# Altium schematic symbol library jlcpcb_2025_04_capacitors_extended_1206.schlib: 2503 symbols (part 6 of 14)
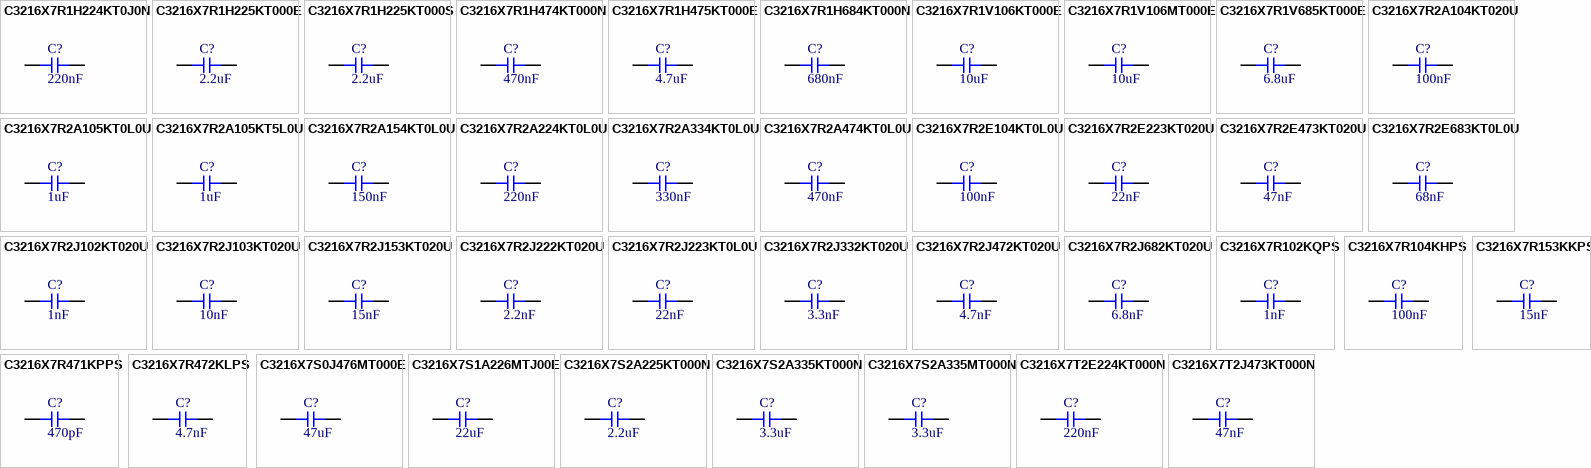
[diagram p67: symbols C3216X7R1H224KT0J0N to C3216X7T2J473KT000N]

## C3216X7R2J153KT020U
designator C?  Capacitance: 15nF  (hidden comment: *)
Capacitor, Ceramic (MLCC), 15nF, ±10%, 630V, X7R, ±10%, SMD 1206; Manufacturer: TDK; Manufacturer Part Number: C3216X7R2J153KT020U; Package Size: 1206; JLCPCB Basic Part: No; JLCPCB Part Number: C76675; Supplier 1: LCSC; Category: Capacitors - MLCC; Supplier Part Number 1: C76675; Tolerance: ±10%; Voltage Rating: 630V; Temperature Coefficient: X7R; RoHS: Yes; ComponentLink1Description: Datasheet; ComponentLink1URL: https://wmsc.lcsc.com/wmsc/upload/file/pdf/v2/lcsc/2304140030_TDK-C3216X7R2J153KT020U_C76675.pdf; ComponentLink2Description: JLCPCB Part URL; ComponentLink2URL: https://jlcpcb.com/partdetail/C76675; ComponentLink3Description: LCSC Part URL; ComponentLink3URL: https://lcsc.com/product-detail/Multilayer-Ceramic-Capacitors-MLCC---SMD-SMT_TDK-TDK-C3216X7R2J153KT020U_C76675.html
footprint CAP-1206 (1206 (3216M) Capacitor)
pins: 1, 2

## C3216X7R2J222KT020U
designator C?  Capacitance: 2.2nF  (hidden comment: *)
Capacitor, Ceramic (MLCC), 2.2nF, ±10%, 630V, X7R, ±10%, SMD 1206; Manufacturer: TDK; Manufacturer Part Number: C3216X7R2J222KT020U; Package Size: 1206; JLCPCB Basic Part: No; JLCPCB Part Number: C342855; Supplier 1: LCSC; Category: Capacitors - MLCC; Supplier Part Number 1: C342855; Tolerance: ±10%; Voltage Rating: 630V; Temperature Coefficient: X7R; RoHS: Yes; ComponentLink1Description: Datasheet; ComponentLink1URL: https://wmsc.lcsc.com/wmsc/upload/file/pdf/v2/lcsc/2304140030_TDK-C3216X7R2J222KT020U_C342855.pdf; ComponentLink2Description: JLCPCB Part URL; ComponentLink2URL: https://jlcpcb.com/partdetail/C342855; ComponentLink3Description: LCSC Part URL; ComponentLink3URL: https://lcsc.com/product-detail/Multilayer-Ceramic-Capacitors-MLCC---SMD-SMT_TDK-TDK-C3216X7R2J222KT020U_C342855.html
footprint CAP-1206 (1206 (3216M) Capacitor)
pins: 1, 2

## C3216X7R2J223KT0L0U
designator C?  Capacitance: 22nF  (hidden comment: *)
Capacitor, Ceramic (MLCC), 22nF, ±10%, 630V, X7R, ±10%, SMD 1206; Manufacturer: TDK; Manufacturer Part Number: C3216X7R2J223KT0L0U; Package Size: 1206; JLCPCB Basic Part: No; JLCPCB Part Number: C342858; Supplier 1: LCSC; Category: Capacitors - MLCC; Supplier Part Number 1: C342858; Tolerance: ±10%; Voltage Rating: 630V; Temperature Coefficient: X7R; RoHS: Yes; ComponentLink1Description: Datasheet; ComponentLink1URL: https://wmsc.lcsc.com/wmsc/upload/file/pdf/v2/lcsc/2304140030_TDK-C3216X7R2J223KT0L0U_C342858.pdf; ComponentLink2Description: JLCPCB Part URL; ComponentLink2URL: https://jlcpcb.com/partdetail/C342858; ComponentLink3Description: LCSC Part URL; ComponentLink3URL: https://lcsc.com/product-detail/Multilayer-Ceramic-Capacitors-MLCC---SMD-SMT_TDK-TDK-C3216X7R2J223KT0L0U_C342858.html
footprint CAP-1206 (1206 (3216M) Capacitor)
pins: 1, 2

## C3216X7R2J332KT020U
designator C?  Capacitance: 3.3nF  (hidden comment: *)
Capacitor, Ceramic (MLCC), 3.3nF, ±10%, 630V, X7R, ±10%, SMD 1206; Manufacturer: TDK; Manufacturer Part Number: C3216X7R2J332KT020U; Package Size: 1206; JLCPCB Basic Part: No; JLCPCB Part Number: C76677; Supplier 1: LCSC; Category: Capacitors - MLCC; Supplier Part Number 1: C76677; Tolerance: ±10%; Voltage Rating: 630V; Temperature Coefficient: X7R; RoHS: Yes; ComponentLink1Description: Datasheet; ComponentLink1URL: https://wmsc.lcsc.com/wmsc/upload/file/pdf/v2/lcsc/2304140030_TDK-C3216X7R2J332KT020U_C76677.pdf; ComponentLink2Description: JLCPCB Part URL; ComponentLink2URL: https://jlcpcb.com/partdetail/C76677; ComponentLink3Description: LCSC Part URL; ComponentLink3URL: https://lcsc.com/product-detail/Multilayer-Ceramic-Capacitors-MLCC---SMD-SMT_TDK-TDK-C3216X7R2J332KT020U_C76677.html
footprint CAP-1206 (1206 (3216M) Capacitor)
pins: 1, 2

## C3216X7R2J472KT020U
designator C?  Capacitance: 4.7nF  (hidden comment: *)
Capacitor, Ceramic (MLCC), 4.7nF, ±10%, 630V, X7R, ±10%, SMD 1206; Manufacturer: TDK; Manufacturer Part Number: C3216X7R2J472KT020U; Package Size: 1206; JLCPCB Basic Part: No; JLCPCB Part Number: C342859; Supplier 1: LCSC; Category: Capacitors - MLCC; Supplier Part Number 1: C342859; Tolerance: ±10%; Voltage Rating: 630V; Temperature Coefficient: X7R; RoHS: Yes; ComponentLink1Description: Datasheet; ComponentLink1URL: https://wmsc.lcsc.com/wmsc/upload/file/pdf/v2/lcsc/2304140030_TDK-C3216X7R2J472KT020U_C342859.pdf; ComponentLink2Description: JLCPCB Part URL; ComponentLink2URL: https://jlcpcb.com/partdetail/C342859; ComponentLink3Description: LCSC Part URL; ComponentLink3URL: https://lcsc.com/product-detail/Multilayer-Ceramic-Capacitors-MLCC---SMD-SMT_TDK-TDK-C3216X7R2J472KT020U_C342859.html
footprint CAP-1206 (1206 (3216M) Capacitor)
pins: 1, 2

## C3216X7R2J682KT020U
designator C?  Capacitance: 6.8nF  (hidden comment: *)
Capacitor, Ceramic (MLCC), 6.8nF, ±10%, 630V, X7R, ±10%, SMD 1206; Manufacturer: TDK; Manufacturer Part Number: C3216X7R2J682KT020U; Package Size: 1206; JLCPCB Basic Part: No; JLCPCB Part Number: C694467; Supplier 1: LCSC; Category: Capacitors - MLCC; Supplier Part Number 1: C694467; Tolerance: ±10%; Voltage Rating: 630V; Temperature Coefficient: X7R; RoHS: Yes; ComponentLink1Description: Datasheet; ComponentLink1URL: https://wmsc.lcsc.com/wmsc/upload/file/pdf/v2/lcsc/2304140030_TDK-C3216X7R2J682KT020U_C694467.pdf; ComponentLink2Description: JLCPCB Part URL; ComponentLink2URL: https://jlcpcb.com/partdetail/C694467; ComponentLink3Description: LCSC Part URL; ComponentLink3URL: https://lcsc.com/product-detail/Multilayer-Ceramic-Capacitors-MLCC---SMD-SMT_TDK-TDK-C3216X7R2J682KT020U_C694467.html
footprint CAP-1206 (1206 (3216M) Capacitor)
pins: 1, 2

## C3216X7R102KQPS
designator C?  Capacitance: 1nF  (hidden comment: *)
Capacitor, Ceramic (MLCC), 1nF, ±10%, 2kV, X7R, ±10%, SMD 1206; Manufacturer: Darfon Elec; Manufacturer Part Number: C3216X7R102KQPS; Package Size: 1206; JLCPCB Basic Part: No; JLCPCB Part Number: C725573; Supplier 1: LCSC; Category: Capacitors - MLCC; Supplier Part Number 1: C725573; Tolerance: ±10%; Voltage Rating: 2kV; Temperature Coefficient: X7R; RoHS: Yes; ComponentLink1Description: Datasheet; ComponentLink1URL: https://wmsc.lcsc.com/wmsc/upload/file/pdf/v2/lcsc/2304140030_Darfon-Elec-C3216X7R102KQPS_C725573.pdf; ComponentLink2Description: JLCPCB Part URL; ComponentLink2URL: https://jlcpcb.com/partdetail/C725573; ComponentLink3Description: LCSC Part URL; ComponentLink3URL: https://lcsc.com/product-detail/Multilayer-Ceramic-Capacitors-MLCC---SMD-SMT_Darfon-Elec-Darfon-Elec-C3216X7R102KQPS_C725573.html
footprint CAP-1206 (1206 (3216M) Capacitor)
pins: 1, 2

## C3216X7R104KHPS
designator C?  Capacitance: 100nF  (hidden comment: *)
Capacitor, Ceramic (MLCC), 100nF, ±10%, 100V, X7R, ±10%, SMD 1206; Manufacturer: Darfon Elec; Manufacturer Part Number: C3216X7R104KHPS; Package Size: 1206; JLCPCB Basic Part: No; JLCPCB Part Number: C725584; Supplier 1: LCSC; Category: Capacitors - MLCC; Supplier Part Number 1: C725584; Tolerance: ±10%; Voltage Rating: 100V; Temperature Coefficient: X7R; RoHS: Yes; ComponentLink1Description: Datasheet; ComponentLink1URL: https://wmsc.lcsc.com/wmsc/upload/file/pdf/v2/lcsc/2304140030_Darfon-Elec-C3216X7R104KHPS_C725584.pdf; ComponentLink2Description: JLCPCB Part URL; ComponentLink2URL: https://jlcpcb.com/partdetail/C725584; ComponentLink3Description: LCSC Part URL; ComponentLink3URL: https://lcsc.com/product-detail/Multilayer-Ceramic-Capacitors-MLCC---SMD-SMT_Darfon-Elec-Darfon-Elec-C3216X7R104KHPS_C725584.html
footprint CAP-1206 (1206 (3216M) Capacitor)
pins: 1, 2

## C3216X7R153KKPS
designator C?  Capacitance: 15nF  (hidden comment: *)
Capacitor, Ceramic (MLCC), 15nF, ±10%, 250V, X7R, ±10%, SMD 1206; Manufacturer: Darfon Elec; Manufacturer Part Number: C3216X7R153KKPS; Package Size: 1206; JLCPCB Basic Part: No; JLCPCB Part Number: C725583; Supplier 1: LCSC; Category: Capacitors - MLCC; Supplier Part Number 1: C725583; Tolerance: ±10%; Voltage Rating: 250V; Temperature Coefficient: X7R; RoHS: Yes; ComponentLink1Description: Datasheet; ComponentLink1URL: https://wmsc.lcsc.com/wmsc/upload/file/pdf/v2/lcsc/2304140030_Darfon-Elec-C3216X7R153KKPS_C725583.pdf; ComponentLink2Description: JLCPCB Part URL; ComponentLink2URL: https://jlcpcb.com/partdetail/C725583; ComponentLink3Description: LCSC Part URL; ComponentLink3URL: https://lcsc.com/product-detail/Multilayer-Ceramic-Capacitors-MLCC---SMD-SMT_Darfon-Elec-Darfon-Elec-C3216X7R153KKPS_C725583.html
footprint CAP-1206 (1206 (3216M) Capacitor)
pins: 1, 2

## C3216X7R471KPPS
designator C?  Capacitance: 470pF  (hidden comment: *)
Capacitor, Ceramic (MLCC), 470pF, ±10%, 1kV, X7R, ±10%, SMD 1206; Manufacturer: Darfon Elec; Manufacturer Part Number: C3216X7R471KPPS; Package Size: 1206; JLCPCB Basic Part: No; JLCPCB Part Number: C725581; Supplier 1: LCSC; Category: Capacitors - MLCC; Supplier Part Number 1: C725581; Tolerance: ±10%; Voltage Rating: 1kV; Temperature Coefficient: X7R; RoHS: Yes; ComponentLink1Description: Datasheet; ComponentLink1URL: https://wmsc.lcsc.com/wmsc/upload/file/pdf/v2/lcsc/2304140030_Darfon-Elec-C3216X7R471KPPS_C725581.pdf; ComponentLink2Description: JLCPCB Part URL; ComponentLink2URL: https://jlcpcb.com/partdetail/C725581; ComponentLink3Description: LCSC Part URL; ComponentLink3URL: https://lcsc.com/product-detail/Multilayer-Ceramic-Capacitors-MLCC---SMD-SMT_Darfon-Elec-Darfon-Elec-C3216X7R471KPPS_C725581.html
footprint CAP-1206 (1206 (3216M) Capacitor)
pins: 1, 2

## C3216X7R472KLPS
designator C?  Capacitance: 4.7nF  (hidden comment: *)
Capacitor, Ceramic (MLCC), 4.7nF, ±10%, 500V, X7R, ±10%, SMD 1206; Manufacturer: Darfon Elec; Manufacturer Part Number: C3216X7R472KLPS; Package Size: 1206; JLCPCB Basic Part: No; JLCPCB Part Number: C725577; Supplier 1: LCSC; Category: Capacitors - MLCC; Supplier Part Number 1: C725577; Tolerance: ±10%; Voltage Rating: 500V; Temperature Coefficient: X7R; RoHS: Yes; ComponentLink1Description: Datasheet; ComponentLink1URL: https://wmsc.lcsc.com/wmsc/upload/file/pdf/v2/lcsc/2304140030_Darfon-Elec-C3216X7R472KLPS_C725577.pdf; ComponentLink2Description: JLCPCB Part URL; ComponentLink2URL: https://jlcpcb.com/partdetail/C725577; ComponentLink3Description: LCSC Part URL; ComponentLink3URL: https://lcsc.com/product-detail/Multilayer-Ceramic-Capacitors-MLCC---SMD-SMT_Darfon-Elec-Darfon-Elec-C3216X7R472KLPS_C725577.html
footprint CAP-1206 (1206 (3216M) Capacitor)
pins: 1, 2

## C3216X7S0J476MT000E
designator C?  Capacitance: 47uF  (hidden comment: *)
Capacitor, Ceramic (MLCC), 47uF, ±20%, 6.3V, X7S, ±20%, SMD 1206; Manufacturer: TDK; Manufacturer Part Number: C3216X7S0J476MT000E; Package Size: 1206; JLCPCB Basic Part: No; JLCPCB Part Number: C342599; Supplier 1: LCSC; Category: Capacitors - MLCC; Supplier Part Number 1: C342599; Tolerance: ±20%; Voltage Rating: 6.3V; Temperature Coefficient: X7S; RoHS: Yes; ComponentLink1Description: Datasheet; ComponentLink1URL: https://wmsc.lcsc.com/wmsc/upload/file/pdf/v2/lcsc/2304140030_TDK-C3216X7S0J476MT000E_C342599.pdf; ComponentLink2Description: JLCPCB Part URL; ComponentLink2URL: https://jlcpcb.com/partdetail/C342599; ComponentLink3Description: LCSC Part URL; ComponentLink3URL: https://lcsc.com/product-detail/Multilayer-Ceramic-Capacitors-MLCC---SMD-SMT_TDK-TDK-C3216X7S0J476MT000E_C342599.html
footprint CAP-1206 (1206 (3216M) Capacitor)
pins: 1, 2

## C3216X7S1A226MTJ00E
designator C?  Capacitance: 22uF  (hidden comment: *)
Capacitor, Ceramic (MLCC), 22uF, ±20%, 10V, X7S, ±20%, SMD 1206; Manufacturer: TDK; Manufacturer Part Number: C3216X7S1A226MTJ00E; Package Size: 1206; JLCPCB Basic Part: No; JLCPCB Part Number: C880699; Supplier 1: LCSC; Category: Capacitors - MLCC; Supplier Part Number 1: C880699; Tolerance: ±20%; Voltage Rating: 10V; Temperature Coefficient: X7S; RoHS: Yes; ComponentLink1Description: Datasheet; ComponentLink1URL: https://wmsc.lcsc.com/wmsc/upload/file/pdf/v2/lcsc/2304140030_TDK-C3216X7S1A226MTJ00E_C880699.pdf; ComponentLink2Description: JLCPCB Part URL; ComponentLink2URL: https://jlcpcb.com/partdetail/C880699; ComponentLink3Description: LCSC Part URL; ComponentLink3URL: https://lcsc.com/product-detail/Multilayer-Ceramic-Capacitors-MLCC---SMD-SMT_TDK-TDK-C3216X7S1A226MTJ00E_C880699.html
footprint CAP-1206 (1206 (3216M) Capacitor)
pins: 1, 2

## C3216X7S2A225KT000N
designator C?  Capacitance: 2.2uF  (hidden comment: *)
Capacitor, Ceramic (MLCC), 2.2uF, ±10%, 100V, X7S, ±10%, SMD 1206; Manufacturer: TDK; Manufacturer Part Number: C3216X7S2A225KT000N; Package Size: 1206; JLCPCB Basic Part: No; JLCPCB Part Number: C338052; Supplier 1: LCSC; Category: Capacitors - MLCC; Supplier Part Number 1: C338052; Tolerance: ±10%; Voltage Rating: 100V; Temperature Coefficient: X7S; RoHS: Yes; ComponentLink1Description: Datasheet; ComponentLink1URL: https://wmsc.lcsc.com/wmsc/upload/file/pdf/v2/lcsc/2304140030_TDK-C3216X7S2A225KT000N_C338052.pdf; ComponentLink2Description: JLCPCB Part URL; ComponentLink2URL: https://jlcpcb.com/partdetail/C338052; ComponentLink3Description: LCSC Part URL; ComponentLink3URL: https://lcsc.com/product-detail/Multilayer-Ceramic-Capacitors-MLCC---SMD-SMT_TDK-TDK-C3216X7S2A225KT000N_C338052.html
footprint CAP-1206 (1206 (3216M) Capacitor)
pins: 1, 2

## C3216X7S2A335KT000N
designator C?  Capacitance: 3.3uF  (hidden comment: *)
Capacitor, Ceramic (MLCC), 3.3uF, ±10%, 100V, X7S, ±10%, SMD 1206; Manufacturer: TDK; Manufacturer Part Number: C3216X7S2A335KT000N; Package Size: 1206; JLCPCB Basic Part: No; JLCPCB Part Number: C694468; Supplier 1: LCSC; Category: Capacitors - MLCC; Supplier Part Number 1: C694468; Tolerance: ±10%; Voltage Rating: 100V; Temperature Coefficient: X7S; RoHS: Yes; ComponentLink1Description: Datasheet; ComponentLink1URL: https://wmsc.lcsc.com/wmsc/upload/file/pdf/v2/lcsc/2304140030_TDK-C3216X7S2A335KT000N_C694468.pdf; ComponentLink2Description: JLCPCB Part URL; ComponentLink2URL: https://jlcpcb.com/partdetail/C694468; ComponentLink3Description: LCSC Part URL; ComponentLink3URL: https://lcsc.com/product-detail/Multilayer-Ceramic-Capacitors-MLCC---SMD-SMT_TDK-TDK-C3216X7S2A335KT000N_C694468.html
footprint CAP-1206 (1206 (3216M) Capacitor)
pins: 1, 2

## C3216X7S2A335MT000N
designator C?  Capacitance: 3.3uF  (hidden comment: *)
Capacitor, Ceramic (MLCC), 3.3uF, ±20%, 100V, X7S, ±20%, SMD 1206; Manufacturer: TDK; Manufacturer Part Number: C3216X7S2A335MT000N; Package Size: 1206; JLCPCB Basic Part: No; JLCPCB Part Number: C695361; Supplier 1: LCSC; Category: Capacitors - MLCC; Supplier Part Number 1: C695361; Tolerance: ±20%; Voltage Rating: 100V; Temperature Coefficient: X7S; RoHS: Yes; ComponentLink1Description: Datasheet; ComponentLink1URL: https://wmsc.lcsc.com/wmsc/upload/file/pdf/v2/lcsc/2304140030_TDK-C3216X7S2A335MT000N_C695361.pdf; ComponentLink2Description: JLCPCB Part URL; ComponentLink2URL: https://jlcpcb.com/partdetail/C695361; ComponentLink3Description: LCSC Part URL; ComponentLink3URL: https://lcsc.com/product-detail/Multilayer-Ceramic-Capacitors-MLCC---SMD-SMT_TDK-TDK-C3216X7S2A335MT000N_C695361.html
footprint CAP-1206 (1206 (3216M) Capacitor)
pins: 1, 2

## C3216X7T2E224KT000N
designator C?  Capacitance: 220nF  (hidden comment: *)
Capacitor, Ceramic (MLCC), 220nF, ±10%, 250V, X7T, ±10%, SMD 1206; Manufacturer: TDK; Manufacturer Part Number: C3216X7T2E224KT000N; Package Size: 1206; JLCPCB Basic Part: No; JLCPCB Part Number: C342750; Supplier 1: LCSC; Category: Capacitors - MLCC; Supplier Part Number 1: C342750; Tolerance: ±10%; Voltage Rating: 250V; Temperature Coefficient: X7T; RoHS: Yes; ComponentLink1Description: Datasheet; ComponentLink1URL: https://wmsc.lcsc.com/wmsc/upload/file/pdf/v2/lcsc/2304140030_TDK-C3216X7T2E224KT000N_C342750.pdf; ComponentLink2Description: JLCPCB Part URL; ComponentLink2URL: https://jlcpcb.com/partdetail/C342750; ComponentLink3Description: LCSC Part URL; ComponentLink3URL: https://lcsc.com/product-detail/Multilayer-Ceramic-Capacitors-MLCC---SMD-SMT_TDK-TDK-C3216X7T2E224KT000N_C342750.html
footprint CAP-1206 (1206 (3216M) Capacitor)
pins: 1, 2

## C3216X7T2J473KT000N
designator C?  Capacitance: 47nF  (hidden comment: *)
Capacitor, Ceramic (MLCC), 47nF, ±10%, 630V, X7T, ±10%, SMD 1206; Manufacturer: TDK; Manufacturer Part Number: C3216X7T2J473KT000N; Package Size: 1206; JLCPCB Basic Part: No; JLCPCB Part Number: C338056; Supplier 1: LCSC; Category: Capacitors - MLCC; Supplier Part Number 1: C338056; Tolerance: ±10%; Voltage Rating: 630V; Temperature Coefficient: X7T; RoHS: Yes; ComponentLink1Description: Datasheet; ComponentLink1URL: https://wmsc.lcsc.com/wmsc/upload/file/pdf/v2/lcsc/1912111437_TDK-C3216X7T2J473KT000N_C338056.pdf; ComponentLink2Description: JLCPCB Part URL; ComponentLink2URL: https://jlcpcb.com/partdetail/C338056; ComponentLink3Description: LCSC Part URL; ComponentLink3URL: https://lcsc.com/product-detail/Multilayer-Ceramic-Capacitors-MLCC---SMD-SMT_TDK-TDK-C3216X7T2J473KT000N_C338056.html
footprint CAP-1206 (1206 (3216M) Capacitor)
pins: 1, 2

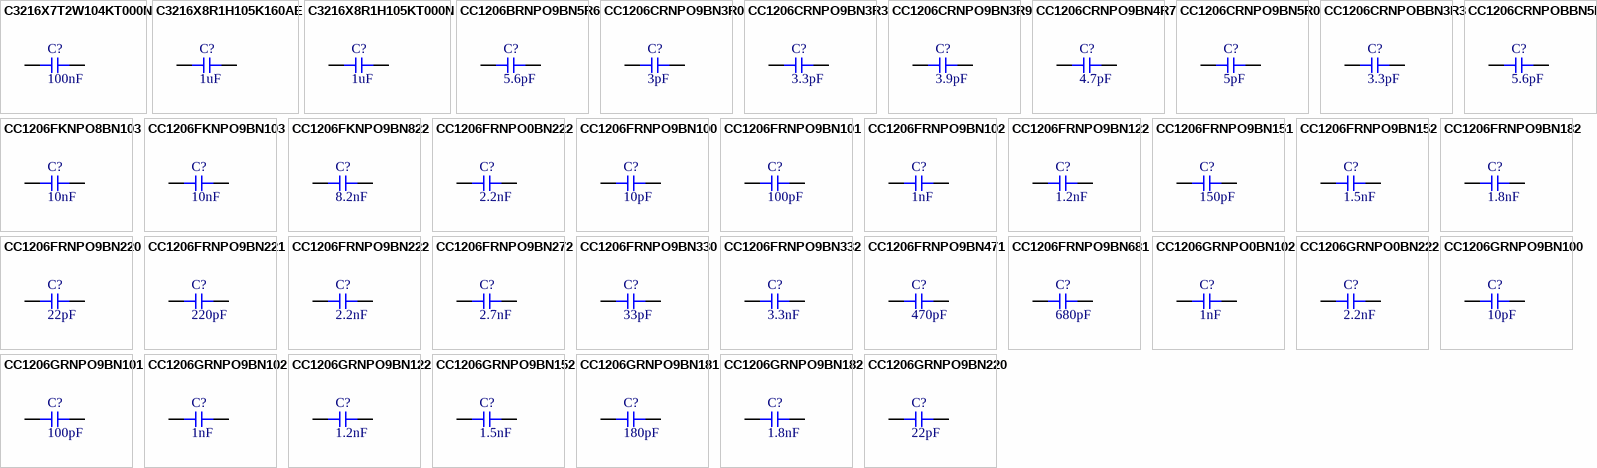
[diagram p23: symbols C3216X7T2W104KT000N to CC1206GRNPO9BN220]

## C3216X7T2W104KT000N
designator C?  Capacitance: 100nF  (hidden comment: *)
Capacitor, Ceramic (MLCC), 100nF, ±10%, 450V, X7T, ±10%, SMD 1206; Manufacturer: TDK; Manufacturer Part Number: C3216X7T2W104KT000N; Package Size: 1206; JLCPCB Basic Part: No; JLCPCB Part Number: C342732; Supplier 1: LCSC; Category: Capacitors - MLCC; Supplier Part Number 1: C342732; Tolerance: ±10%; Voltage Rating: 450V; Temperature Coefficient: X7T; RoHS: Yes; ComponentLink1Description: Datasheet; ComponentLink1URL: https://wmsc.lcsc.com/wmsc/upload/file/pdf/v2/lcsc/2304140030_TDK-C3216X7T2W104KT000N_C342732.pdf; ComponentLink2Description: JLCPCB Part URL; ComponentLink2URL: https://jlcpcb.com/partdetail/C342732; ComponentLink3Description: LCSC Part URL; ComponentLink3URL: https://lcsc.com/product-detail/Multilayer-Ceramic-Capacitors-MLCC---SMD-SMT_TDK-TDK-C3216X7T2W104KT000N_C342732.html
footprint CAP-1206 (1206 (3216M) Capacitor)
pins: 1, 2

## C3216X8R1H105K160AE
designator C?  Capacitance: 1uF  (hidden comment: *)
Capacitor, Ceramic (MLCC), 1uF, ±10%, 50V, X8R, ±10%, SMD 1206; Manufacturer: TDK; Manufacturer Part Number: C3216X8R1H105K160AE; Package Size: 1206; JLCPCB Basic Part: No; JLCPCB Part Number: C2179097; Supplier 1: LCSC; Category: Capacitors - MLCC; Supplier Part Number 1: C2179097; Tolerance: ±10%; Voltage Rating: 50V; Temperature Coefficient: X8R; RoHS: Yes; ComponentLink1Description: Datasheet; ComponentLink1URL: https://wmsc.lcsc.com/wmsc/upload/file/pdf/v2/lcsc/2304140030_TDK-C3216X8R1H105K160AE_C2179097.pdf; ComponentLink2Description: JLCPCB Part URL; ComponentLink2URL: https://jlcpcb.com/partdetail/C2179097; ComponentLink3Description: LCSC Part URL; ComponentLink3URL: https://lcsc.com/product-detail/Multilayer-Ceramic-Capacitors-MLCC---SMD-SMT_TDK-TDK-C3216X8R1H105K160AE_C2179097.html
footprint CAP-1206 (1206 (3216M) Capacitor)
pins: 1, 2

## C3216X8R1H105KT000N
designator C?  Capacitance: 1uF  (hidden comment: *)
Capacitor, Ceramic (MLCC), 1uF, ±10%, 50V, X8R, ±10%, SMD 1206; Manufacturer: TDK; Manufacturer Part Number: C3216X8R1H105KT000N; Package Size: 1206; JLCPCB Basic Part: No; JLCPCB Part Number: C445688; Supplier 1: LCSC; Category: Capacitors - MLCC; Supplier Part Number 1: C445688; Tolerance: ±10%; Voltage Rating: 50V; Temperature Coefficient: X8R; RoHS: Yes; ComponentLink1Description: Datasheet; ComponentLink1URL: https://wmsc.lcsc.com/wmsc/upload/file/pdf/v2/lcsc/2304140030_TDK-C3216X8R1H105KT000N_C445688.pdf; ComponentLink2Description: JLCPCB Part URL; ComponentLink2URL: https://jlcpcb.com/partdetail/C445688; ComponentLink3Description: LCSC Part URL; ComponentLink3URL: https://lcsc.com/product-detail/Multilayer-Ceramic-Capacitors-MLCC---SMD-SMT_TDK-TDK-C3216X8R1H105KT000N_C445688.html
footprint CAP-1206 (1206 (3216M) Capacitor)
pins: 1, 2

## CC1206BRNPO9BN5R6
designator C?  Capacitance: 5.6pF  (hidden comment: *)
Capacitor, Ceramic (MLCC), 5.6pF, 50V, NP0, SMD 1206; Manufacturer: YAGEO; Manufacturer Part Number: CC1206BRNPO9BN5R6; Package Size: 1206; JLCPCB Basic Part: No; JLCPCB Part Number: C326778; Supplier 1: LCSC; Category: Capacitors - MLCC; Supplier Part Number 1: C326778; Voltage Rating: 50V; Temperature Coefficient: NP0; RoHS: Yes; ComponentLink1Description: Datasheet; ComponentLink1URL: https://wmsc.lcsc.com/wmsc/upload/file/pdf/v2/lcsc/1811151646_YAGEO-CC1206BRNPO9BN5R6_C326778.pdf; ComponentLink2Description: JLCPCB Part URL; ComponentLink2URL: https://jlcpcb.com/partdetail/C326778; ComponentLink3Description: LCSC Part URL; ComponentLink3URL: https://lcsc.com/product-detail/Multilayer-Ceramic-Capacitors-MLCC---SMD-SMT_YAGEO-YAGEO-CC1206BRNPO9BN5R6_C326778.html
footprint CAP-1206 (1206 (3216M) Capacitor)
pins: 1, 2

## CC1206CRNPO9BN3R0
designator C?  Capacitance: 3pF  (hidden comment: *)
Capacitor, Ceramic (MLCC), 3pF, 50V, NP0, SMD 1206; Manufacturer: YAGEO; Manufacturer Part Number: CC1206CRNPO9BN3R0; Package Size: 1206; JLCPCB Basic Part: No; JLCPCB Part Number: C700499; Supplier 1: LCSC; Category: Capacitors - MLCC; Supplier Part Number 1: C700499; Voltage Rating: 50V; Temperature Coefficient: NP0; RoHS: Yes; ComponentLink1Description: Datasheet; ComponentLink1URL: https://wmsc.lcsc.com/wmsc/upload/file/pdf/v2/lcsc/2010202004_YAGEO-CC1206CRNPO9BN3R0_C700499.pdf; ComponentLink2Description: JLCPCB Part URL; ComponentLink2URL: https://jlcpcb.com/partdetail/C700499; ComponentLink3Description: LCSC Part URL; ComponentLink3URL: https://lcsc.com/product-detail/Multilayer-Ceramic-Capacitors-MLCC---SMD-SMT_YAGEO-YAGEO-CC1206CRNPO9BN3R0_C700499.html
footprint CAP-1206 (1206 (3216M) Capacitor)
pins: 1, 2

## CC1206CRNPO9BN3R3
designator C?  Capacitance: 3.3pF  (hidden comment: *)
Capacitor, Ceramic (MLCC), 3.3pF, 50V, NP0, SMD 1206; Manufacturer: YAGEO; Manufacturer Part Number: CC1206CRNPO9BN3R3; Package Size: 1206; JLCPCB Basic Part: No; JLCPCB Part Number: C577057; Supplier 1: LCSC; Category: Capacitors - MLCC; Supplier Part Number 1: C577057; Voltage Rating: 50V; Temperature Coefficient: NP0; RoHS: Yes; ComponentLink1Description: Datasheet; ComponentLink1URL: https://wmsc.lcsc.com/wmsc/upload/file/pdf/v2/lcsc/2203081130_YAGEO-CC1206CRNPO9BN3R3_C577057.pdf; ComponentLink2Description: JLCPCB Part URL; ComponentLink2URL: https://jlcpcb.com/partdetail/C577057; ComponentLink3Description: LCSC Part URL; ComponentLink3URL: https://lcsc.com/product-detail/Multilayer-Ceramic-Capacitors-MLCC---SMD-SMT_YAGEO-YAGEO-CC1206CRNPO9BN3R3_C577057.html
footprint CAP-1206 (1206 (3216M) Capacitor)
pins: 1, 2

## CC1206CRNPO9BN3R9
designator C?  Capacitance: 3.9pF  (hidden comment: *)
Capacitor, Ceramic (MLCC), 3.9pF, 50V, NP0, SMD 1206; Manufacturer: YAGEO; Manufacturer Part Number: CC1206CRNPO9BN3R9; Package Size: 1206; JLCPCB Basic Part: No; JLCPCB Part Number: C577058; Supplier 1: LCSC; Category: Capacitors - MLCC; Supplier Part Number 1: C577058; Voltage Rating: 50V; Temperature Coefficient: NP0; RoHS: Yes; ComponentLink1Description: Datasheet; ComponentLink1URL: https://wmsc.lcsc.com/wmsc/upload/file/pdf/v2/lcsc/2204021130_YAGEO-CC1206CRNPO9BN3R9_C577058.pdf; ComponentLink2Description: JLCPCB Part URL; ComponentLink2URL: https://jlcpcb.com/partdetail/C577058; ComponentLink3Description: LCSC Part URL; ComponentLink3URL: https://lcsc.com/product-detail/Multilayer-Ceramic-Capacitors-MLCC---SMD-SMT_YAGEO-YAGEO-CC1206CRNPO9BN3R9_C577058.html
footprint CAP-1206 (1206 (3216M) Capacitor)
pins: 1, 2

## CC1206CRNPO9BN4R7
designator C?  Capacitance: 4.7pF  (hidden comment: *)
Capacitor, Ceramic (MLCC), 4.7pF, 50V, NP0, SMD 1206; Manufacturer: YAGEO; Manufacturer Part Number: CC1206CRNPO9BN4R7; Package Size: 1206; JLCPCB Basic Part: No; JLCPCB Part Number: C577059; Supplier 1: LCSC; Category: Capacitors - MLCC; Supplier Part Number 1: C577059; Voltage Rating: 50V; Temperature Coefficient: NP0; RoHS: Yes; ComponentLink1Description: Datasheet; ComponentLink1URL: https://wmsc.lcsc.com/wmsc/upload/file/pdf/v2/lcsc/2209151800_YAGEO-CC1206CRNPO9BN4R7_C577059.pdf; ComponentLink2Description: JLCPCB Part URL; ComponentLink2URL: https://jlcpcb.com/partdetail/C577059; ComponentLink3Description: LCSC Part URL; ComponentLink3URL: https://lcsc.com/product-detail/Multilayer-Ceramic-Capacitors-MLCC---SMD-SMT_YAGEO-YAGEO-CC1206CRNPO9BN4R7_C577059.html
footprint CAP-1206 (1206 (3216M) Capacitor)
pins: 1, 2

## CC1206CRNPO9BN5R0
designator C?  Capacitance: 5pF  (hidden comment: *)
Capacitor, Ceramic (MLCC), 5pF, 50V, NP0, SMD 1206; Manufacturer: YAGEO; Manufacturer Part Number: CC1206CRNPO9BN5R0; Package Size: 1206; JLCPCB Basic Part: No; JLCPCB Part Number: C2935251; Supplier 1: LCSC; Category: Capacitors - MLCC; Supplier Part Number 1: C2935251; Voltage Rating: 50V; Temperature Coefficient: NP0; RoHS: Yes; ComponentLink1Description: Datasheet; ComponentLink1URL: https://wmsc.lcsc.com/wmsc/upload/file/pdf/v2/lcsc/2201121700_YAGEO-CC1206CRNPO9BN5R0_C2935251.pdf; ComponentLink2Description: JLCPCB Part URL; ComponentLink2URL: https://jlcpcb.com/partdetail/C2935251; ComponentLink3Description: LCSC Part URL; ComponentLink3URL: https://lcsc.com/product-detail/Multilayer-Ceramic-Capacitors-MLCC---SMD-SMT_YAGEO-YAGEO-CC1206CRNPO9BN5R0_C2935251.html
footprint CAP-1206 (1206 (3216M) Capacitor)
pins: 1, 2

## CC1206CRNPOBBN3R3
designator C?  Capacitance: 3.3pF  (hidden comment: *)
Capacitor, Ceramic (MLCC), 3.3pF, 500V, SMD 1206; Manufacturer: YAGEO; Manufacturer Part Number: CC1206CRNPOBBN3R3; Package Size: 1206; JLCPCB Basic Part: No; JLCPCB Part Number: C577067; Supplier 1: LCSC; Category: Capacitors - MLCC; Supplier Part Number 1: C577067; Voltage Rating: 500V; RoHS: Yes; ComponentLink1Description: Datasheet; ComponentLink1URL: https://wmsc.lcsc.com/wmsc/upload/file/pdf/v2/lcsc/2306061129_YAGEO-CC1206CRNPOBBN3R3_C577067.pdf; ComponentLink2Description: JLCPCB Part URL; ComponentLink2URL: https://jlcpcb.com/partdetail/C577067; ComponentLink3Description: LCSC Part URL; ComponentLink3URL: https://lcsc.com/product-detail/Multilayer-Ceramic-Capacitors-MLCC---SMD-SMT_YAGEO-YAGEO-CC1206CRNPOBBN3R3_C577067.html
footprint CAP-1206 (1206 (3216M) Capacitor)
pins: 1, 2

## CC1206CRNPOBBN5R6
designator C?  Capacitance: 5.6pF  (hidden comment: *)
Capacitor, Ceramic (MLCC), 5.6pF, 500V, SMD 1206; Manufacturer: YAGEO; Manufacturer Part Number: CC1206CRNPOBBN5R6; Package Size: 1206; JLCPCB Basic Part: No; JLCPCB Part Number: C577070; Supplier 1: LCSC; Category: Capacitors - MLCC; Supplier Part Number 1: C577070; Voltage Rating: 500V; RoHS: Yes; ComponentLink1Description: Datasheet; ComponentLink1URL: https://wmsc.lcsc.com/wmsc/upload/file/pdf/v2/lcsc/2306061129_YAGEO-CC1206CRNPOBBN5R6_C577070.pdf; ComponentLink2Description: JLCPCB Part URL; ComponentLink2URL: https://jlcpcb.com/partdetail/C577070; ComponentLink3Description: LCSC Part URL; ComponentLink3URL: https://lcsc.com/product-detail/Multilayer-Ceramic-Capacitors-MLCC---SMD-SMT_YAGEO-YAGEO-CC1206CRNPOBBN5R6_C577070.html
footprint CAP-1206 (1206 (3216M) Capacitor)
pins: 1, 2

## CC1206FKNPO8BN103
designator C?  Capacitance: 10nF  (hidden comment: *)
Capacitor, Ceramic (MLCC), 10nF, ±1%, 25V, NP0, ±1%, SMD 1206; Manufacturer: YAGEO; Manufacturer Part Number: CC1206FKNPO8BN103; Package Size: 1206; JLCPCB Basic Part: No; JLCPCB Part Number: C541596; Supplier 1: LCSC; Category: Capacitors - MLCC; Supplier Part Number 1: C541596; Tolerance: ±1%; Voltage Rating: 25V; Temperature Coefficient: NP0; RoHS: Yes; ComponentLink1Description: Datasheet; ComponentLink1URL: https://wmsc.lcsc.com/wmsc/upload/file/pdf/v2/lcsc/2006151214_YAGEO-CC1206FKNPO8BN103_C541596.pdf; ComponentLink2Description: JLCPCB Part URL; ComponentLink2URL: https://jlcpcb.com/partdetail/C541596; ComponentLink3Description: LCSC Part URL; ComponentLink3URL: https://lcsc.com/product-detail/Multilayer-Ceramic-Capacitors-MLCC---SMD-SMT_YAGEO-YAGEO-CC1206FKNPO8BN103_C541596.html
footprint CAP-1206 (1206 (3216M) Capacitor)
pins: 1, 2

## CC1206FKNPO9BN103
designator C?  Capacitance: 10nF  (hidden comment: *)
Capacitor, Ceramic (MLCC), 10nF, ±1%, 50V, NP0, ±1%, SMD 1206; Manufacturer: YAGEO; Manufacturer Part Number: CC1206FKNPO9BN103; Package Size: 1206; JLCPCB Basic Part: No; JLCPCB Part Number: C541597; Supplier 1: LCSC; Category: Capacitors - MLCC; Supplier Part Number 1: C541597; Tolerance: ±1%; Voltage Rating: 50V; Temperature Coefficient: NP0; RoHS: Yes; ComponentLink1Description: Datasheet; ComponentLink1URL: https://wmsc.lcsc.com/wmsc/upload/file/pdf/v2/lcsc/2006151214_YAGEO-CC1206FKNPO9BN103_C541597.pdf; ComponentLink2Description: JLCPCB Part URL; ComponentLink2URL: https://jlcpcb.com/partdetail/C541597; ComponentLink3Description: LCSC Part URL; ComponentLink3URL: https://lcsc.com/product-detail/Multilayer-Ceramic-Capacitors-MLCC---SMD-SMT_YAGEO-YAGEO-CC1206FKNPO9BN103_C541597.html
footprint CAP-1206 (1206 (3216M) Capacitor)
pins: 1, 2

## CC1206FKNPO9BN822
designator C?  Capacitance: 8.2nF  (hidden comment: *)
Capacitor, Ceramic (MLCC), 8.2nF, ±1%, 50V, NP0, ±1%, SMD 1206; Manufacturer: YAGEO; Manufacturer Part Number: CC1206FKNPO9BN822; Package Size: 1206; JLCPCB Basic Part: No; JLCPCB Part Number: C541598; Supplier 1: LCSC; Category: Capacitors - MLCC; Supplier Part Number 1: C541598; Tolerance: ±1%; Voltage Rating: 50V; Temperature Coefficient: NP0; RoHS: Yes; ComponentLink1Description: Datasheet; ComponentLink1URL: https://wmsc.lcsc.com/wmsc/upload/file/pdf/v2/lcsc/2006151214_YAGEO-CC1206FKNPO9BN822_C541598.pdf; ComponentLink2Description: JLCPCB Part URL; ComponentLink2URL: https://jlcpcb.com/partdetail/C541598; ComponentLink3Description: LCSC Part URL; ComponentLink3URL: https://lcsc.com/product-detail/Multilayer-Ceramic-Capacitors-MLCC---SMD-SMT_YAGEO-YAGEO-CC1206FKNPO9BN822_C541598.html
footprint CAP-1206 (1206 (3216M) Capacitor)
pins: 1, 2

## CC1206FRNPO0BN222
designator C?  Capacitance: 2.2nF  (hidden comment: *)
Capacitor, Ceramic (MLCC), 2.2nF, ±1%, 100V, NP0, ±1%, SMD 1206; Manufacturer: YAGEO; Manufacturer Part Number: CC1206FRNPO0BN222; Package Size: 1206; JLCPCB Basic Part: No; JLCPCB Part Number: C577076; Supplier 1: LCSC; Category: Capacitors - MLCC; Supplier Part Number 1: C577076; Tolerance: ±1%; Voltage Rating: 100V; Temperature Coefficient: NP0; RoHS: Yes; ComponentLink1Description: Datasheet; ComponentLink1URL: https://wmsc.lcsc.com/wmsc/upload/file/pdf/v2/lcsc/2311211121_YAGEO-CC1206FRNPO0BN222_C577076.pdf; ComponentLink2Description: JLCPCB Part URL; ComponentLink2URL: https://jlcpcb.com/partdetail/C577076; ComponentLink3Description: LCSC Part URL; ComponentLink3URL: https://lcsc.com/product-detail/Multilayer-Ceramic-Capacitors-MLCC---SMD-SMT_YAGEO-YAGEO-CC1206FRNPO0BN222_C577076.html
footprint CAP-1206 (1206 (3216M) Capacitor)
pins: 1, 2

## CC1206FRNPO9BN100
designator C?  Capacitance: 10pF  (hidden comment: *)
Capacitor, Ceramic (MLCC), 10pF, 50V, NP0, SMD 1206; Manufacturer: YAGEO; Manufacturer Part Number: CC1206FRNPO9BN100; Package Size: 1206; JLCPCB Basic Part: No; JLCPCB Part Number: C541578; Supplier 1: LCSC; Category: Capacitors - MLCC; Supplier Part Number 1: C541578; Voltage Rating: 50V; Temperature Coefficient: NP0; RoHS: Yes; ComponentLink1Description: Datasheet; ComponentLink1URL: https://wmsc.lcsc.com/wmsc/upload/file/pdf/v2/lcsc/2006151213_YAGEO-CC1206FRNPO9BN100_C541578.pdf; ComponentLink2Description: JLCPCB Part URL; ComponentLink2URL: https://jlcpcb.com/partdetail/C541578; ComponentLink3Description: LCSC Part URL; ComponentLink3URL: https://lcsc.com/product-detail/Multilayer-Ceramic-Capacitors-MLCC---SMD-SMT_YAGEO-YAGEO-CC1206FRNPO9BN100_C541578.html
footprint CAP-1206 (1206 (3216M) Capacitor)
pins: 1, 2

## CC1206FRNPO9BN101
designator C?  Capacitance: 100pF  (hidden comment: *)
Capacitor, Ceramic (MLCC), 100pF, 50V, NP0, SMD 1206; Manufacturer: YAGEO; Manufacturer Part Number: CC1206FRNPO9BN101; Package Size: 1206; JLCPCB Basic Part: No; JLCPCB Part Number: C541579; Supplier 1: LCSC; Category: Capacitors - MLCC; Supplier Part Number 1: C541579; Voltage Rating: 50V; Temperature Coefficient: NP0; RoHS: Yes; ComponentLink1Description: Datasheet; ComponentLink1URL: https://wmsc.lcsc.com/wmsc/upload/file/pdf/v2/lcsc/2006151213_YAGEO-CC1206FRNPO9BN101_C541579.pdf; ComponentLink2Description: JLCPCB Part URL; ComponentLink2URL: https://jlcpcb.com/partdetail/C541579; ComponentLink3Description: LCSC Part URL; ComponentLink3URL: https://lcsc.com/product-detail/Multilayer-Ceramic-Capacitors-MLCC---SMD-SMT_YAGEO-YAGEO-CC1206FRNPO9BN101_C541579.html
footprint CAP-1206 (1206 (3216M) Capacitor)
pins: 1, 2

## CC1206FRNPO9BN102
designator C?  Capacitance: 1nF  (hidden comment: *)
Capacitor, Ceramic (MLCC), 1nF, ±1%, 50V, NP0, ±1%, SMD 1206; Manufacturer: YAGEO; Manufacturer Part Number: CC1206FRNPO9BN102; Package Size: 1206; JLCPCB Basic Part: No; JLCPCB Part Number: C541590; Supplier 1: LCSC; Category: Capacitors - MLCC; Supplier Part Number 1: C541590; Tolerance: ±1%; Voltage Rating: 50V; Temperature Coefficient: NP0; RoHS: Yes; ComponentLink1Description: Datasheet; ComponentLink1URL: https://wmsc.lcsc.com/wmsc/upload/file/pdf/v2/lcsc/2006151214_YAGEO-CC1206FRNPO9BN102_C541590.pdf; ComponentLink2Description: JLCPCB Part URL; ComponentLink2URL: https://jlcpcb.com/partdetail/C541590; ComponentLink3Description: LCSC Part URL; ComponentLink3URL: https://lcsc.com/product-detail/Multilayer-Ceramic-Capacitors-MLCC---SMD-SMT_YAGEO-YAGEO-CC1206FRNPO9BN102_C541590.html
footprint CAP-1206 (1206 (3216M) Capacitor)
pins: 1, 2

## CC1206FRNPO9BN122
designator C?  Capacitance: 1.2nF  (hidden comment: *)
Capacitor, Ceramic (MLCC), 1.2nF, ±1%, 50V, NP0, ±1%, SMD 1206; Manufacturer: YAGEO; Manufacturer Part Number: CC1206FRNPO9BN122; Package Size: 1206; JLCPCB Basic Part: No; JLCPCB Part Number: C541591; Supplier 1: LCSC; Category: Capacitors - MLCC; Supplier Part Number 1: C541591; Tolerance: ±1%; Voltage Rating: 50V; Temperature Coefficient: NP0; RoHS: Yes; ComponentLink1Description: Datasheet; ComponentLink1URL: https://wmsc.lcsc.com/wmsc/upload/file/pdf/v2/lcsc/2006151214_YAGEO-CC1206FRNPO9BN122_C541591.pdf; ComponentLink2Description: JLCPCB Part URL; ComponentLink2URL: https://jlcpcb.com/partdetail/C541591; ComponentLink3Description: LCSC Part URL; ComponentLink3URL: https://lcsc.com/product-detail/Multilayer-Ceramic-Capacitors-MLCC---SMD-SMT_YAGEO-YAGEO-CC1206FRNPO9BN122_C541591.html
footprint CAP-1206 (1206 (3216M) Capacitor)
pins: 1, 2

## CC1206FRNPO9BN151
designator C?  Capacitance: 150pF  (hidden comment: *)
Capacitor, Ceramic (MLCC), 150pF, ±1%, 50V, NP0, ±1%, SMD 1206; Manufacturer: YAGEO; Manufacturer Part Number: CC1206FRNPO9BN151; Package Size: 1206; JLCPCB Basic Part: No; JLCPCB Part Number: C541581; Supplier 1: LCSC; Category: Capacitors - MLCC; Supplier Part Number 1: C541581; Tolerance: ±1%; Voltage Rating: 50V; Temperature Coefficient: NP0; RoHS: Yes; ComponentLink1Description: Datasheet; ComponentLink1URL: https://wmsc.lcsc.com/wmsc/upload/file/pdf/v2/lcsc/2006151213_YAGEO-CC1206FRNPO9BN151_C541581.pdf; ComponentLink2Description: JLCPCB Part URL; ComponentLink2URL: https://jlcpcb.com/partdetail/C541581; ComponentLink3Description: LCSC Part URL; ComponentLink3URL: https://lcsc.com/product-detail/Multilayer-Ceramic-Capacitors-MLCC---SMD-SMT_YAGEO-YAGEO-CC1206FRNPO9BN151_C541581.html
footprint CAP-1206 (1206 (3216M) Capacitor)
pins: 1, 2

## CC1206FRNPO9BN152
designator C?  Capacitance: 1.5nF  (hidden comment: *)
Capacitor, Ceramic (MLCC), 1.5nF, ±1%, 50V, NP0, ±1%, SMD 1206; Manufacturer: YAGEO; Manufacturer Part Number: CC1206FRNPO9BN152; Package Size: 1206; JLCPCB Basic Part: No; JLCPCB Part Number: C541592; Supplier 1: LCSC; Category: Capacitors - MLCC; Supplier Part Number 1: C541592; Tolerance: ±1%; Voltage Rating: 50V; Temperature Coefficient: NP0; RoHS: Yes; ComponentLink1Description: Datasheet; ComponentLink1URL: https://wmsc.lcsc.com/wmsc/upload/file/pdf/v2/lcsc/2006151214_YAGEO-CC1206FRNPO9BN152_C541592.pdf; ComponentLink2Description: JLCPCB Part URL; ComponentLink2URL: https://jlcpcb.com/partdetail/C541592; ComponentLink3Description: LCSC Part URL; ComponentLink3URL: https://lcsc.com/product-detail/Multilayer-Ceramic-Capacitors-MLCC---SMD-SMT_YAGEO-YAGEO-CC1206FRNPO9BN152_C541592.html
footprint CAP-1206 (1206 (3216M) Capacitor)
pins: 1, 2

## CC1206FRNPO9BN182
designator C?  Capacitance: 1.8nF  (hidden comment: *)
Capacitor, Ceramic (MLCC), 1.8nF, 50V, NP0, SMD 1206; Manufacturer: YAGEO; Manufacturer Part Number: CC1206FRNPO9BN182; Package Size: 1206; JLCPCB Basic Part: No; JLCPCB Part Number: C541593; Supplier 1: LCSC; Category: Capacitors - MLCC; Supplier Part Number 1: C541593; Voltage Rating: 50V; Temperature Coefficient: NP0; RoHS: Yes; ComponentLink1Description: Datasheet; ComponentLink1URL: https://wmsc.lcsc.com/wmsc/upload/file/pdf/v2/lcsc/2006151214_YAGEO-CC1206FRNPO9BN182_C541593.pdf; ComponentLink2Description: JLCPCB Part URL; ComponentLink2URL: https://jlcpcb.com/partdetail/C541593; ComponentLink3Description: LCSC Part URL; ComponentLink3URL: https://lcsc.com/product-detail/Multilayer-Ceramic-Capacitors-MLCC---SMD-SMT_YAGEO-YAGEO-CC1206FRNPO9BN182_C541593.html
footprint CAP-1206 (1206 (3216M) Capacitor)
pins: 1, 2

## CC1206FRNPO9BN220
designator C?  Capacitance: 22pF  (hidden comment: *)
Capacitor, Ceramic (MLCC), 22pF, ±1%, 50V, NP0, ±1%, SMD 1206; Manufacturer: YAGEO; Manufacturer Part Number: CC1206FRNPO9BN220; Package Size: 1206; JLCPCB Basic Part: No; JLCPCB Part Number: C541582; Supplier 1: LCSC; Category: Capacitors - MLCC; Supplier Part Number 1: C541582; Tolerance: ±1%; Voltage Rating: 50V; Temperature Coefficient: NP0; RoHS: Yes; ComponentLink1Description: Datasheet; ComponentLink1URL: https://wmsc.lcsc.com/wmsc/upload/file/pdf/v2/lcsc/2006151213_YAGEO-CC1206FRNPO9BN220_C541582.pdf; ComponentLink2Description: JLCPCB Part URL; ComponentLink2URL: https://jlcpcb.com/partdetail/C541582; ComponentLink3Description: LCSC Part URL; ComponentLink3URL: https://lcsc.com/product-detail/Multilayer-Ceramic-Capacitors-MLCC---SMD-SMT_YAGEO-YAGEO-CC1206FRNPO9BN220_C541582.html
footprint CAP-1206 (1206 (3216M) Capacitor)
pins: 1, 2

## CC1206FRNPO9BN221
designator C?  Capacitance: 220pF  (hidden comment: *)
Capacitor, Ceramic (MLCC), 220pF, 50V, NP0, SMD 1206; Manufacturer: YAGEO; Manufacturer Part Number: CC1206FRNPO9BN221; Package Size: 1206; JLCPCB Basic Part: No; JLCPCB Part Number: C541583; Supplier 1: LCSC; Category: Capacitors - MLCC; Supplier Part Number 1: C541583; Voltage Rating: 50V; Temperature Coefficient: NP0; RoHS: Yes; ComponentLink1Description: Datasheet; ComponentLink1URL: https://wmsc.lcsc.com/wmsc/upload/file/pdf/v2/lcsc/2006151213_YAGEO-CC1206FRNPO9BN221_C541583.pdf; ComponentLink2Description: JLCPCB Part URL; ComponentLink2URL: https://jlcpcb.com/partdetail/C541583; ComponentLink3Description: LCSC Part URL; ComponentLink3URL: https://lcsc.com/product-detail/Multilayer-Ceramic-Capacitors-MLCC---SMD-SMT_YAGEO-YAGEO-CC1206FRNPO9BN221_C541583.html
footprint CAP-1206 (1206 (3216M) Capacitor)
pins: 1, 2

## CC1206FRNPO9BN222
designator C?  Capacitance: 2.2nF  (hidden comment: *)
Capacitor, Ceramic (MLCC), 2.2nF, ±1%, 50V, NP0, ±1%, SMD 1206; Manufacturer: YAGEO; Manufacturer Part Number: CC1206FRNPO9BN222; Package Size: 1206; JLCPCB Basic Part: No; JLCPCB Part Number: C541594; Supplier 1: LCSC; Category: Capacitors - MLCC; Supplier Part Number 1: C541594; Tolerance: ±1%; Voltage Rating: 50V; Temperature Coefficient: NP0; RoHS: Yes; ComponentLink1Description: Datasheet; ComponentLink1URL: https://wmsc.lcsc.com/wmsc/upload/file/pdf/v2/lcsc/2006151214_YAGEO-CC1206FRNPO9BN222_C541594.pdf; ComponentLink2Description: JLCPCB Part URL; ComponentLink2URL: https://jlcpcb.com/partdetail/C541594; ComponentLink3Description: LCSC Part URL; ComponentLink3URL: https://lcsc.com/product-detail/Multilayer-Ceramic-Capacitors-MLCC---SMD-SMT_YAGEO-YAGEO-CC1206FRNPO9BN222_C541594.html
footprint CAP-1206 (1206 (3216M) Capacitor)
pins: 1, 2

## CC1206FRNPO9BN272
designator C?  Capacitance: 2.7nF  (hidden comment: *)
Capacitor, Ceramic (MLCC), 2.7nF, ±1%, 50V, NP0, ±1%, SMD 1206; Manufacturer: YAGEO; Manufacturer Part Number: CC1206FRNPO9BN272; Package Size: 1206; JLCPCB Basic Part: No; JLCPCB Part Number: C541595; Supplier 1: LCSC; Category: Capacitors - MLCC; Supplier Part Number 1: C541595; Tolerance: ±1%; Voltage Rating: 50V; Temperature Coefficient: NP0; RoHS: Yes; ComponentLink1Description: Datasheet; ComponentLink1URL: https://wmsc.lcsc.com/wmsc/upload/file/pdf/v2/lcsc/2006151214_YAGEO-CC1206FRNPO9BN272_C541595.pdf; ComponentLink2Description: JLCPCB Part URL; ComponentLink2URL: https://jlcpcb.com/partdetail/C541595; ComponentLink3Description: LCSC Part URL; ComponentLink3URL: https://lcsc.com/product-detail/Multilayer-Ceramic-Capacitors-MLCC---SMD-SMT_YAGEO-YAGEO-CC1206FRNPO9BN272_C541595.html
footprint CAP-1206 (1206 (3216M) Capacitor)
pins: 1, 2

## CC1206FRNPO9BN330
designator C?  Capacitance: 33pF  (hidden comment: *)
Capacitor, Ceramic (MLCC), 33pF, 50V, NP0, SMD 1206; Manufacturer: YAGEO; Manufacturer Part Number: CC1206FRNPO9BN330; Package Size: 1206; JLCPCB Basic Part: No; JLCPCB Part Number: C541584; Supplier 1: LCSC; Category: Capacitors - MLCC; Supplier Part Number 1: C541584; Voltage Rating: 50V; Temperature Coefficient: NP0; RoHS: Yes; ComponentLink1Description: Datasheet; ComponentLink1URL: https://wmsc.lcsc.com/wmsc/upload/file/pdf/v2/lcsc/2006151213_YAGEO-CC1206FRNPO9BN330_C541584.pdf; ComponentLink2Description: JLCPCB Part URL; ComponentLink2URL: https://jlcpcb.com/partdetail/C541584; ComponentLink3Description: LCSC Part URL; ComponentLink3URL: https://lcsc.com/product-detail/Multilayer-Ceramic-Capacitors-MLCC---SMD-SMT_YAGEO-YAGEO-CC1206FRNPO9BN330_C541584.html
footprint CAP-1206 (1206 (3216M) Capacitor)
pins: 1, 2

## CC1206FRNPO9BN332
designator C?  Capacitance: 3.3nF  (hidden comment: *)
Capacitor, Ceramic (MLCC), 3.3nF, ±1%, 50V, NP0, ±1%, SMD 1206; Manufacturer: YAGEO; Manufacturer Part Number: CC1206FRNPO9BN332; Package Size: 1206; JLCPCB Basic Part: No; JLCPCB Part Number: C541599; Supplier 1: LCSC; Category: Capacitors - MLCC; Supplier Part Number 1: C541599; Tolerance: ±1%; Voltage Rating: 50V; Temperature Coefficient: NP0; RoHS: Yes; ComponentLink1Description: Datasheet; ComponentLink1URL: https://wmsc.lcsc.com/wmsc/upload/file/pdf/v2/lcsc/2006151214_YAGEO-CC1206FRNPO9BN332_C541599.pdf; ComponentLink2Description: JLCPCB Part URL; ComponentLink2URL: https://jlcpcb.com/partdetail/C541599; ComponentLink3Description: LCSC Part URL; ComponentLink3URL: https://lcsc.com/product-detail/Multilayer-Ceramic-Capacitors-MLCC---SMD-SMT_YAGEO-YAGEO-CC1206FRNPO9BN332_C541599.html
footprint CAP-1206 (1206 (3216M) Capacitor)
pins: 1, 2
